# Altium footprint library mfmc_footprints.PcbLib: 156 footprints (part 2 of 10)
Each footprint in its own frame and in the unit in brackets; x right, y up, seen from the top. Pads: shape width x height; smd on the part's side, far side on the other; paste and mask are expansions set on the pad; w line width, h text height; cw(c..) or ccw(c..) is an arc to the next point about the centre after c.
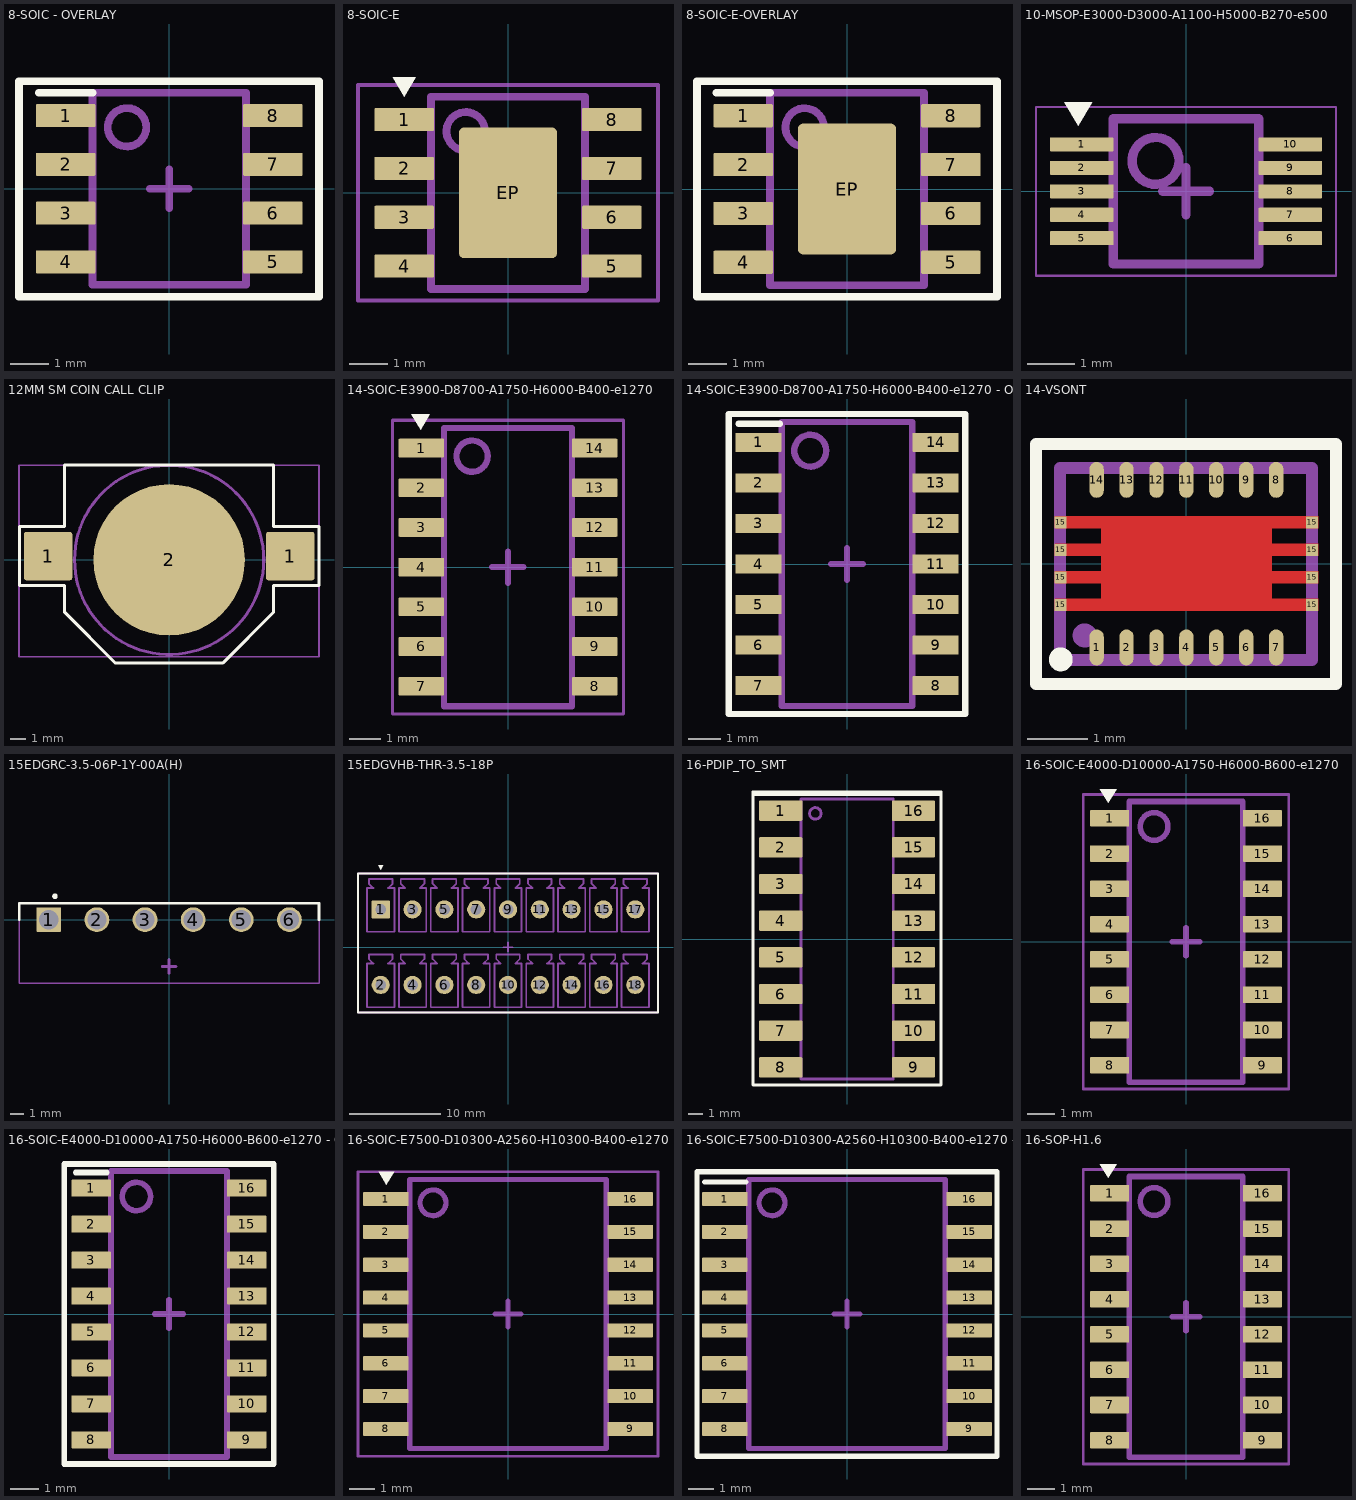
[diagram p1: the footprints below, top view; thin cyan lines are the x and y axes]

## 8-SOIC - OVERLAY [mm] "SOIC, 8-Leads, Body 4,91x3,90mm, Pitch 1,27mm, IPC Medium Density"
height 1.75
pads (8):
  rrect10% 1.55x0.6 smd: 1(-2.7,1.905) 2(-2.7,0.635) 3(-2.7,-0.635) 4(-2.7,-1.905) 5(2.7,-1.905) 6(2.7,-0.635) 7(2.7,0.635) 8(2.7,1.905)
Top Overlay:
  lines w0.2: -3.4,2.5 -2,2.5 ; -3.913,-2.813 -3.913,2.8 3.9,2.8 3.9,-2.813 -3.913,-2.813
Top Courtyard:
  lines w0.1: -3.9,-2.8 3.9,-2.8 3.9,2.8 -3.9,2.8 -3.9,-2.8
  lines w0.2: -0.5,0 0.5,0 ; 0,-0.5 0,0.5
Top Assembly:
  circle w0.2: c-1.1,1.6 r0.5
  lines w0.2: -2,-2.5 -2,2.5 2,2.5 2,-2.5 -2,-2.5
Top Designator (Mech10):
  text ".Designator" at -7.624,-0.514 h1.52
3D body "SOIC127P600X175-8N.step": height 1.75, standoff 0, extent -2.997,-2.5 2.997,2.5

## 8-SOIC-E [mm] "SOIC, 8-Leads, Exposed Pad, Body 4,91x3,90mm, Pitch 1,27mm, IPC Medium Density"
height 1.75
pads (9):
  rrect10% 1.55x0.6 smd: 1(-2.7,1.905) 2(-2.7,0.635) 3(-2.7,-0.635) 4(-2.7,-1.905) 5(2.7,-1.905) 6(2.7,-0.635) 7(2.7,0.635) 8(2.7,1.905)
  rrect10% 2.55x3.4 smd: EP(0,0)
Top Overlay:
  region: -2.7,2.5 -3,3 -2.4,3
Top Courtyard:
  lines w0.1: -3.9,-2.8 3.9,-2.8 3.9,2.8 -3.9,2.8 -3.9,-2.8
  lines w0.2: -0.5,0 0.5,0 ; 0,-0.5 0,0.5
Top Assembly:
  circle w0.2: c-1.1,1.6 r0.5
  lines w0.2: -2,-2.5 -2,2.5 2,2.5 2,-2.5 -2,-2.5
Top Designator (Mech10):
  text ".Designator" at -7.618,-0.433 h1.52
3D body "SOIC127P600X175-8N.step": height 1.75, standoff 0, extent -2.997,-2.5 2.997,2.5

## 8-SOIC-E-OVERLAY [mm] "SOIC, 8-Leads, Exposed Pad, Body 4,91x3,90mm, Pitch 1,27mm, IPC Medium Density"
height 1.75
pads (9):
  rrect10% 1.55x0.6 smd: 1(-2.7,1.905) 2(-2.7,0.635) 3(-2.7,-0.635) 4(-2.7,-1.905) 5(2.7,-1.905) 6(2.7,-0.635) 7(2.7,0.635) 8(2.7,1.905)
  rrect10% 2.55x3.4 smd: EP(0,0)
Top Overlay:
  lines w0.2: -3.4,2.5 -2,2.5 ; -3.9,-2.8 -3.9,2.8 3.9,2.8 3.9,-2.8 -3.9,-2.8
Top Courtyard:
  lines w0.1: -3.9,-2.8 -3.9,2.8 3.9,2.8 3.9,-2.8 -3.9,-2.8
  lines w0.2: -0.5,0 0.5,0 ; 0,-0.5 0,0.5
Top Assembly:
  circle w0.2: c-1.1,1.6 r0.5
  lines w0.2: -2,-2.5 2,-2.5 2,2.5 -2,2.5 -2,-2.5
Top Designator (Mech10):
  text ".Designator" at -7.618,-0.508 h1.52
3D body "SOIC127P600X175-8N.step": height 1.75, standoff 0, extent -2.997,-2.5 2.997,2.5

## 10-MSOP-E3000-D3000-A1100-H5000-B270-e500 [mm] "10-Lead MSOP Plastic Package"
height 1.1
pads (10):
  rrect10% 1.35x0.3 smd: 1(-2.225,1) 2(-2.225,0.5) 3(-2.225,0) 4(-2.225,-0.5) 5(-2.225,-1) 6(2.225,-1) 7(2.225,-0.5) 8(2.225,0) 9(2.225,0.5) 10(2.225,1)
Top Overlay:
  region: -2.3,1.4 -2.6,1.9 -2,1.9
Top Courtyard:
  lines w0.05: -3.2,-1.8 -3.2,1.8 3.2,1.8 3.2,-1.8 -3.2,-1.8
  lines w0.2: -0.5,0 0.5,0 ; 0,-0.5 0,0.5
Top Assembly:
  circle w0.2: c-0.65,0.65 r0.5
  lines w0.2: -1.55,-1.55 -1.55,1.55 1.55,1.55 1.55,-1.55 -1.55,-1.55
Top Designator (Mech10):
  text ".Designator" at -7.618,-0.445 h1.52
3D body "TSSOP50P490X110-10N.step": height 1.1, standoff 0, extent -2.45,-1.55 2.45,1.55

## 12MM SM COIN CALL CLIP [mm]
height 3.2
pads (3):
  rrect10% 3.2x3.2 smd: 1(-8,0.25) 1(8,0.25)
  round 10 smd: 2(0,0)
Top Overlay:
  lines w0.2: -9.9,-1.7 -6.9,-1.7 -6.9,-3.47 -3.57,-6.8 3.57,-6.8 6.9,-3.47 6.9,-1.7 9.9,-1.7 9.9,2.2 6.9,2.2 6.9,6.25 -6.9,6.25 -6.9,2.2 -9.9,2.2 -9.9,-1.7
Top Courtyard:
  lines w0.1: -9.919,-6.407 9.9,-6.407 9.9,6.25 -9.919,6.25 -9.919,-6.407
  lines w0.2: -0.5,-0.015 0.5,-0.015 ; 0,-0.515 0,0.485
Top Assembly:
  circle w0.2: c0,0 r6.25
Top Designator (Mech10):
  text ".Designator" at -7.618,-0.783 h1.52
3D body "12mm SM COIN CELL CLIP.STEP": height 3.19, standoff 0.01, extent -9.46,-6.5 9.46,5.568

## 14-SOIC-E3900-D8700-A1750-H6000-B400-e1270 [mm]
height 1.75
pads (14):
  rrect10% 1.45x0.6 smd: 1(-2.775,3.81) 2(-2.775,2.54) 3(-2.775,1.27) 4(-2.775,0) 5(-2.775,-1.27) 6(-2.775,-2.54) 7(-2.775,-3.81) 8(2.775,-3.81) 9(2.775,-2.54) 10(2.775,-1.27) 11(2.775,0) 12(2.775,1.27) 13(2.775,2.54) 14(2.775,3.81)
Top Overlay:
  region: -2.8,4.4 -3.1,4.9 -2.5,4.9
Top Courtyard:
  lines w0.1: -3.7,-4.7 3.7,-4.7 3.7,4.7 -3.7,4.7 -3.7,-4.7
  lines w0.2: -0.5,0 0.5,0 ; 0,-0.5 0,0.5
Top Assembly:
  circle w0.2: c-1.15,3.55 r0.5
  lines w0.2: -2.05,-4.45 2.05,-4.45 2.05,4.45 -2.05,4.45 -2.05,-4.45
Top Designator (Mech10):
  text ".Designator" at -7.618,-0.433 h1.52
3D body "14-SOIC-E3900-D8700-A1750-H6000-B400-e1270.step": height 1.75, standoff 0, extent -3,-4.45 3,4.45

## 14-SOIC-E3900-D8700-A1750-H6000-B400-e1270 - OVERLAY [mm]
height 1.75
pads (14):
  rrect10% 1.45x0.6 smd: 1(-2.775,3.81) 2(-2.775,2.54) 3(-2.775,1.27) 4(-2.775,0) 5(-2.775,-1.27) 6(-2.775,-2.54) 7(-2.775,-3.81) 8(2.775,-3.81) 9(2.775,-2.54) 10(2.775,-1.27) 11(2.775,0) 12(2.775,1.27) 13(2.775,2.54) 14(2.775,3.81)
Top Overlay:
  lines w0.2: -3.4,4.4 -2.1,4.4 ; -3.7,-4.7 3.7,-4.7 3.7,4.7 -3.7,4.7 -3.7,-4.7
Top Courtyard:
  lines w0.1: -3.7,-4.7 3.7,-4.7 3.7,4.7 -3.7,4.7 -3.7,-4.7
  lines w0.2: -0.5,0 0.5,0 ; 0,-0.5 0,0.5
Top Assembly:
  circle w0.2: c-1.15,3.55 r0.5
  lines w0.2: -2.05,-4.45 2.05,-4.45 2.05,4.45 -2.05,4.45 -2.05,-4.45
Top Designator (Mech10):
  text ".Designator" at -7.618,-0.508 h1.52
3D body "14-SOIC-E3900-D8700-A1750-H6000-B400-e1270.step": height 1.75, standoff 0, extent -3,-4.45 3,4.45

## 14-VSONT [mm] "14-Pin VSON with Exposed Thermal Pad"
height 1.08
pads (22):
  oval 0.24x0.6 smd mask+0.07: 1(-1.5,-1.4) 2(-1,-1.4) 3(-0.5,-1.4) 4(0,-1.4) 5(0.5,-1.4) 6(1,-1.4) 7(1.5,-1.4) 8(1.5,1.4) 9(1,1.4) 10(0.5,1.4) 11(0,1.4) 12(-0.5,1.4) 13(-1,1.4) 14(-1.5,1.4)
  rect 0.2x0.2 smd mask+0: 15(-2.1,-0.69) 15(-2.1,-0.23) 15(-2.1,0.23) 15(-2.1,0.69) 15(2.1,-0.69) 15(2.1,-0.23) 15(2.1,0.23) 15(2.1,0.69)
Top Layer:
  region: -2.2,0.79 2.2,0.79 2.2,0.59 1.425,0.59 1.425,0.33 2.2,0.33 2.2,0.13 1.425,0.13 1.425,-0.13 2.2,-0.13 2.2,-0.33 1.425,-0.33 1.425,-0.59 2.2,-0.59 2.2,-0.79 -2.2,-0.79 -2.2,-0.59 -1.425,-0.59 -1.425,-0.33 -2.2,-0.33 -2.2,-0.13 -1.425,-0.13 -1.425,0.13 -2.2,0.13 -2.2,0.33 -1.425,0.33 -1.425,0.59 -2.2,0.59
Top Overlay:
  circle w0.2: c-2.1,-1.6 r0.1
  lines w0.2: -2.513,-2.013 2.5,-2.013 2.5,2 -2.513,2 -2.513,-2.013
Top Courtyard:
  lines w0.1: -2.513,-2.013 2.5,-2.013 2.5,2 -2.513,2 -2.513,-2.013
  lines w0.2: -0.4,0 0.4,0 ; 0,-0.4 0,0.4
Top Assembly:
  circle w0.2: c-1.7,-1.2 r0.1
  lines w0.2: -2.113,-1.613 2.1,-1.613 2.1,1.6 -2.113,1.6 -2.113,-1.613
Top Designator (Mech10):
  text ".Designator" at -7.624,-0.514 h1.52
3D body "User Library-R-PVSON-N14.step": height 1.06, standoff 0.01, extent -2.077,-1.587 2.077,1.587

## 15EDGRC-3.5-06P-1Y-00A(H) [mm] "Pluggable Terminal Blocksnominal current7A.Rated voltage(?/2):250V,pitch:3.5mm,Color:green,Contact surface:Tin"
pads (6):
  rrect10% 1.8x1.8 hole 1.4: 1(-8.75,0)
  round 1.8 hole 1.4: 2(-5.25,0) 3(-1.75,0) 4(1.75,0) 5(5.25,0) 6(8.75,0)
Top Overlay:
  circle w0.2: c-8.3,1.7 r0.1
  lines w0.2: -10.9,0 -10.9,1.2 10.9,1.2 10.9,0
Top Courtyard:
  lines w0.1: -10.913,-4.613 10.9,-4.613 ; -10.913,-4.613 -10.913,1.2 ; -10.913,-4.613 10.9,-4.613 ; -10.913,-4.613 -10.913,1.2 ; -10.913,1.2 10.9,1.2 ; -10.913,1.2 10.9,1.2 ; 10.9,-4.613 10.9,1.2 ; 10.9,-4.613 10.9,1.2
  lines w0.2: -0.5,-3.4 0.5,-3.4 ; 0,-3.9 0,-2.9
Top Designator (Mech10):
  text ".Designator" at -7.618,-8.058 h1.52
3D body "15EDGK-3.5-06P-14-00A(H).stp": height 7.6, standoff -3.5, extent -10.9,-17 10.9,-1.4
3D body "15EDGRC-3.5-06P-14-00A(H).stp": height 7.29, standoff -3.35, extent -10.9,-8 10.9,1.2

## 15EDGVHB-THR-3.5-18P [mm] "2-rows PCB Socket 3.5mm pitch 8A"
height 13.3
pads (18):
  rrect10% 2x2 hole 1.2: 1(-14,4.15)
  round 2 hole 1.2: 2(-14,-4.15) 3(-10.5,4.15) 4(-10.5,-4.15) 5(-7,4.15) 6(-7,-4.15) 7(-3.5,4.15) 8(-3.5,-4.15) 9(0,4.15) 10(0,-4.15) 11(3.5,4.15) 12(3.5,-4.15) 13(7,4.15) 14(7,-4.15) 15(10.5,4.15) 16(10.5,-4.15) 17(14,4.15) 18(14,-4.15)
Top Overlay:
  region: -14,8.5 -14.3,9 -13.7,9
  lines w0.2: -16.5,-7.2 16.5,-7.2 16.5,8.1 -16.5,8.1 -16.5,-7.2
Top Courtyard:
  lines w0.1: -16.5,-7.2 16.5,-7.2 16.5,8.1 -16.5,8.1 -16.5,-7.2
  lines w0.2: -0.5,0 0.5,0 ; 0,-0.5 0,0.5
Top Assembly:
  drawing of 184 lines, arcs and shapes, not listed
Top Designator (Mech10):
  text ".Designator" at -7.618,0.342 h1.52
3D body "15EDGVHB-THR-3.5-18P-13-10A(H).stp": height 13.31, standoff -2.59, extent -16.5,-7.2 16.5,8.1

## 16-PDIP_TO_SMT [mm]
pads (16):
  rrect10% 3x1.4 smd: 1(-4.6,8.89) 2(-4.6,6.35) 3(-4.6,3.81) 4(-4.6,1.27) 5(-4.6,-1.27) 6(-4.6,-3.81) 7(-4.6,-6.35) 8(-4.6,-8.89) 9(4.6,-8.89) 10(4.6,-6.35) 11(4.6,-3.81) 12(4.6,-1.27) 13(4.6,1.27) 14(4.6,3.81) 15(4.6,6.35) 16(4.6,8.89)
Top Overlay:
  rectangle: -6.5,9.9 6.5,10.2
  lines w0.2: -6.513,-10.113 6.5,-10.113 6.5,10.2 -6.513,10.2 -6.513,-10.113
Top Assembly:
  circle w0.2: c-2.2,8.7 r0.4
  lines w0.2: -3.2,-9.7 3.2,-9.7 3.2,9.7 -3.2,9.7 -3.2,-9.7
Top Designator (Mech10):
  text ".Designator" at -7.624,-0.464 h1.52

## 16-SOIC-E4000-D10000-A1750-H6000-B600-e1270 [mm]
height 1.6
pads (16):
  rrect10% 1.4x0.6 smd: 1(-2.75,4.445) 2(-2.75,3.175) 3(-2.75,1.905) 4(-2.75,0.635) 5(-2.75,-0.635) 6(-2.75,-1.905) 7(-2.75,-3.175) 8(-2.75,-4.445) 9(2.75,-4.445) 10(2.75,-3.175) 11(2.75,-1.905) 12(2.75,-0.635) 13(2.75,0.635) 14(2.75,1.905) 15(2.75,3.175) 16(2.75,4.445)
Top Overlay:
  region: -2.8,5 -3.1,5.5 -2.5,5.5
Top Courtyard:
  lines w0.1: -3.7,-5.3 -3.7,5.3 3.7,5.3 3.7,-5.3 -3.7,-5.3
  lines w0.2: -0.5,0 0.5,0 ; 0,-0.5 0,0.5
Top Assembly:
  circle w0.2: c-1.15,4.15 r0.5
  lines w0.2: -2.05,-5.05 2.05,-5.05 2.05,5.05 -2.05,5.05 -2.05,-5.05
Top Designator (Mech10):
  text ".Designator" at -7.618,-0.508 h1.52
3D body "TSOP127P600X160-16N.step": height 1.6, standoff 0, extent -3,-5.05 3,5.05

## 16-SOIC-E4000-D10000-A1750-H6000-B600-e1270 - OVERLAY [mm]
height 1.6
pads (16):
  rrect10% 1.4x0.6 smd: 1(-2.75,4.445) 2(-2.75,3.175) 3(-2.75,1.905) 4(-2.75,0.635) 5(-2.75,-0.635) 6(-2.75,-1.905) 7(-2.75,-3.175) 8(-2.75,-4.445) 9(2.75,-4.445) 10(2.75,-3.175) 11(2.75,-1.905) 12(2.75,-0.635) 13(2.75,0.635) 14(2.75,1.905) 15(2.75,3.175) 16(2.75,4.445)
Top Overlay:
  lines w0.2: -3.3,5 -2.2,5 ; -3.7,-5.3 3.7,-5.3 3.7,5.3 -3.7,5.3 -3.7,-5.3
Top Courtyard:
  lines w0.1: -3.7,-5.3 3.7,-5.3 3.7,5.3 -3.7,5.3 -3.7,-5.3
  lines w0.2: -0.5,0 0.5,0 ; 0,-0.5 0,0.5
Top Assembly:
  circle w0.2: c-1.15,4.15 r0.5
  lines w0.2: -2.05,-5.05 -2.05,5.05 2.05,5.05 2.05,-5.05 -2.05,-5.05
Top Designator (Mech10):
  text ".Designator" at -7.618,-0.508 h1.52
3D body "TSOP127P600X160-16N.step": height 1.6, standoff 0, extent -3,-5.05 3,5.05

## 16-SOIC-E7500-D10300-A2560-H10300-B400-e1270 [mm] "SOIC, 16-Leads, Body 10,30x7,50mm, Pitch 1,27mm, IPC Medium Density"
height 2.65
pads (16):
  rrect10% 1.75x0.55 smd: 1(-4.725,4.445) 2(-4.725,3.175) 3(-4.725,1.905) 4(-4.725,0.635) 5(-4.725,-0.635) 6(-4.725,-1.905) 7(-4.725,-3.175) 8(-4.725,-4.445) 9(4.725,-4.445) 10(4.725,-3.175) 11(4.725,-1.905) 12(4.725,-0.635) 13(4.725,0.635) 14(4.725,1.905) 15(4.725,3.175) 16(4.725,4.445)
Top Overlay:
  region: -4.7,5 -5,5.5 -4.4,5.5
Top Courtyard:
  lines w0.1: -5.8,-5.5 5.8,-5.5 5.8,5.5 -5.8,5.5 -5.8,-5.5
  lines w0.2: -0.5,0 0.5,0 ; 0,-0.5 0,0.5
Top Assembly:
  circle w0.2: c-2.9,4.3 r0.5
  lines w0.2: -3.8,-5.2 -3.8,5.2 3.8,5.2 3.8,-5.2 -3.8,-5.2
Top Designator (Mech10):
  text ".Designator" at -7.618,-0.508 h1.52
3D body "16-SOIC-E7500-D10300-A2560-H10300-B400-e1270.step": height 2.65, standoff 0, extent -5.15,-5.2 5.15,5.2

## 16-SOIC-E7500-D10300-A2560-H10300-B400-e1270 - OVERLAY [mm] "SOIC, 16-Leads, Body 10,30x7,50mm, Pitch 1,27mm, IPC Medium Density"
height 2.65
pads (16):
  rrect10% 1.75x0.55 smd: 1(-4.725,4.445) 2(-4.725,3.175) 3(-4.725,1.905) 4(-4.725,0.635) 5(-4.725,-0.635) 6(-4.725,-1.905) 7(-4.725,-3.175) 8(-4.725,-4.445) 9(4.725,-4.445) 10(4.725,-3.175) 11(4.725,-1.905) 12(4.725,-0.635) 13(4.725,0.635) 14(4.725,1.905) 15(4.725,3.175) 16(4.725,4.445)
Top Overlay:
  lines w0.2: -5.5,5.1 -3.9,5.1 ; -5.8,-5.5 5.8,-5.5 5.8,5.5 -5.8,5.5 -5.8,-5.5
Top Courtyard:
  lines w0.1: -5.8,-5.5 5.8,-5.5 5.8,5.5 -5.8,5.5 -5.8,-5.5
  lines w0.2: -0.5,0 0.5,0 ; 0,-0.5 0,0.5
Top Assembly:
  circle w0.2: c-2.9,4.3 r0.5
  lines w0.2: -3.8,-5.2 3.8,-5.2 3.8,5.2 -3.8,5.2 -3.8,-5.2
Top Designator (Mech10):
  text ".Designator" at -7.618,-0.508 h1.52
3D body "16-SOIC-E7500-D10300-A2560-H10300-B400-e1270.step": height 2.65, standoff 0, extent -5.15,-5.2 5.15,5.2

## 16-SOP-H1.6 [mm] "TSOP, 16-Leads, Body 9,90x3,90mm, Pitch 1,27mm, IPC Medium Density"
height 1.6
pads (16):
  rrect10% 1.4x0.6 smd: 1(-2.75,4.445) 2(-2.75,3.175) 3(-2.75,1.905) 4(-2.75,0.635) 5(-2.75,-0.635) 6(-2.75,-1.905) 7(-2.75,-3.175) 8(-2.75,-4.445) 9(2.75,-4.445) 10(2.75,-3.175) 11(2.75,-1.905) 12(2.75,-0.635) 13(2.75,0.635) 14(2.75,1.905) 15(2.75,3.175) 16(2.75,4.445)
Top Overlay:
  region: -2.8,5 -3.1,5.5 -2.5,5.5
Top Courtyard:
  lines w0.1: -3.7,-5.3 3.7,-5.3 3.7,5.3 -3.7,5.3 -3.7,-5.3
  lines w0.2: -0.5,0 0.5,0 ; 0,-0.5 0,0.5
Top Assembly:
  circle w0.2: c-1.15,4.15 r0.5
  lines w0.2: -2.05,-5.05 -2.05,5.05 2.05,5.05 2.05,-5.05 -2.05,-5.05
Top Designator (Mech10):
  text ".Designator" at -7.618,-0.433 h1.52
3D body "TSOP127P600X160-16N.step": height 1.6, standoff 0, extent -3,-5.05 3,5.05